# Altium footprint library PCB_IntegratedCircuit.PcbLib: 56 footprints (part 4 of 4)
Each footprint in its own frame and in the unit in brackets; x right, y up, seen from the top. Pads: shape width x height; smd on the part's side, far side on the other; paste and mask are expansions set on the pad; w line width, h text height; cw(c..) or ccw(c..) is an arc to the next point about the centre after c.
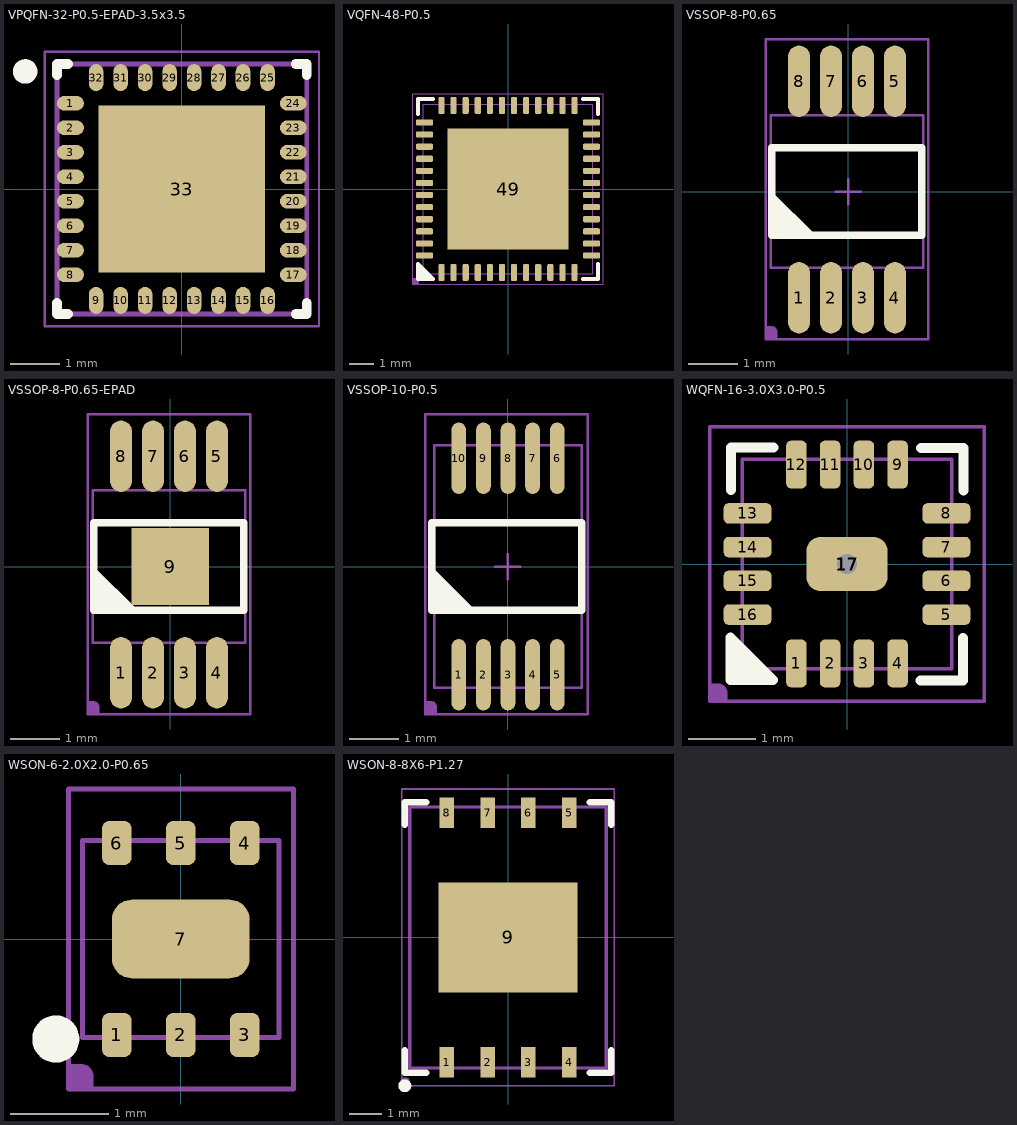
[diagram p3: the footprints below, top view; thin cyan lines are the x and y axes]

## VPQFN-32-P0.5-EPAD-3.5x3.5 [mm] "PQFN, 32-Leads, Body 5.00x5.00mm, Pitch 0.50mm, Thermal Pad 3.50x3.50mm, IPC Medium Density"
height 0.5
pads (33):
  oval 0.55x0.3 smd: 1(-2.275,1.75) 2(-2.275,1.25) 3(-2.275,0.75) 4(-2.275,0.25) 5(-2.275,-0.25) 6(-2.275,-0.75) 7(-2.275,-1.25) 8(-2.275,-1.75) 17(2.275,-1.75) 18(2.275,-1.25) 19(2.275,-0.75) 20(2.275,-0.25) 21(2.275,0.25) 22(2.275,0.75) 23(2.275,1.25) 24(2.275,1.75)
  oval 0.3x0.55 smd: 9(-1.75,-2.275) 10(-1.25,-2.275) 11(-0.75,-2.275) 12(-0.25,-2.275) 13(0.25,-2.275) 14(0.75,-2.275) 15(1.25,-2.275) 16(1.75,-2.275) 25(1.75,2.275) 26(1.25,2.275) 27(0.75,2.275) 28(0.25,2.275) 29(-0.25,2.275) 30(-0.75,2.275) 31(-1.25,2.275) 32(-1.75,2.275)
  rect 3.4x3.4 smd: 33(0,0)
Top Overlay:
  circle w0.25: c-3.2,2.4 r0.125
  lines w0.2: -2.55,-2.325 -2.55,-2.55 -2.325,-2.55 ; -2.55,2.325 -2.55,2.55 -2.325,2.55 ; 2.325,-2.55 2.55,-2.55 2.55,-2.325 ; 2.325,2.55 2.55,2.55 2.55,2.325
Top Assembly (Mech13):
  lines w0.1: -0.5,0 0.5,0 ; 0,-0.5 0,0.5 ; -2.55,-2.55 2.55,-2.55 2.55,2.55 -2.55,2.55 -2.55,-2.55
Top Component:
  lines w0.05: -2.8,-2.8 -2.8,2.8 2.8,2.8 2.8,-2.8 -2.8,-2.8
3D body: height 0.5, standoff 0, extent -2.55,-2.55 2.55,2.55

## VQFN-48-P0.5 [mil]
height 21.65
pads (49):
  rrect50% 10x28 smd: 1(-108.27,-136) 2(-88.58,-136) 3(-68.9,-136) 4(-49.21,-136) 5(-29.53,-136) 6(-9.84,-136) 7(9.84,-136) 8(29.53,-136) 9(49.21,-136) 10(68.9,-136) 11(88.58,-136) 12(108.27,-136) 25(108.27,136) 26(88.58,136) 27(68.9,136) 28(49.21,136) 29(29.53,136) 30(9.84,136) 31(-9.84,136) 32(-29.53,136) 33(-49.21,136) 34(-68.9,136) 35(-88.58,136) 36(-108.27,136)
  rrect50% 28x10 smd: 13(136,-108.27) 14(136,-88.58) 15(136,-68.9) 16(136,-49.21) 17(136,-29.53) 18(136,-9.84) 19(136,9.84) 20(136,29.53) 21(136,49.21) 22(136,68.9) 23(136,88.58) 24(136,108.27) 37(-136,108.27) 38(-136,88.58) 39(-136,68.9) 40(-136,49.21) 41(-136,29.53) 42(-136,9.84) 43(-136,-9.84) 44(-136,-29.53) 45(-136,-49.21) 46(-136,-68.9) 47(-136,-88.58) 48(-136,-108.27)
  rect 196.85x196.85 smd: 49(0,0)
Top Overlay:
  region: -146.67,-146.67 -146.67,-122 -122,-146.67
  lines w6: -146.67,122 -146.67,146.67 -122,146.67 ; 122,-146.67 146.67,-146.67 146.67,-122 ; 122,146.67 146.67,146.67 146.67,122 ; -146.67,-146.67 -146.67,-122 -122,-146.67 -146.67,-146.67
Top Solder:
  region: 108.27,-150 108.27,-122 -108.27,-122 -108.27,-150
  region: 150,108.27 122,108.27 122,-108.27 150,-108.27
  region: -108.27,150 -108.27,122 108.27,122 108.27,150
  rectangle: -150,-108.27 -122,108.27
Top Assembly (Mech13):
  lines w2: -10,0 10,0 ; 0,-10 0,10 ; -137.8,-137.79 137.8,-137.79 137.8,137.8 -137.8,137.8 -137.8,-137.79
Top Component:
  region: -155,-155 -155,-145 -150,-145 -149.01,-145 -147.17,-145.76 -145.76,-147.17 -145,-149.01 -145,-150 -145,-155
  lines w2: -155,-155 155,-155 155,155 -155,155 -155,-155
  text ".Designator" at -41,-20 h80
3D body "QFN50P700X700X55-48L.step": height 21.65, standoff 0, extent -138.59,-138.58 138.58,138.58

## VSSOP-8-P0.65 [mm]
height 1.1
pads (8):
  oval 0.45x1.45 smd: 1(-1,-2.159) 2(-0.35,-2.159) 3(0.3,-2.159) 4(0.95,-2.159) 5(0.95,2.241) 6(0.3,2.241) 7(-0.35,2.241) 8(-1,2.241)
Top Overlay:
  region: -1.549,-0.889 -1.549,0 -0.66,-0.889
  lines w0.152: -1.549,-0.889 1.499,-0.889 1.499,0.889 -1.549,0.889 -1.549,-0.889
Top Assembly (Mech13):
  lines w0.051: -0.254,0 0.254,0 ; 0,-0.254 0,0.254 ; -1.575,-1.55 -1.575,1.55 1.525,1.55 1.525,-1.55 -1.575,-1.55
Top Component:
  region: -1.7,-2.988 -1.7,-2.734 -1.573,-2.734 -1.548,-2.734 -1.501,-2.753 -1.465,-2.789 -1.446,-2.835 -1.446,-2.861 -1.446,-2.988
  lines w0.051: -1.676,-2.997 1.626,-2.997 1.626,3.099 -1.676,3.099 -1.676,-2.997
  text ".Designator" at -1.041,-0.508 h2.03
3D body "DGK0008A.stp": height 0.97, standoff 0, extent -1.524,-2.451 1.473,2.451

## VSSOP-8-P0.65-EPAD [mm]
height 1.1
pads (9):
  oval 0.45x1.45 smd: 1(-1,-2.159) 2(-0.35,-2.159) 3(0.3,-2.159) 4(0.95,-2.159) 5(0.95,2.241) 6(0.3,2.241) 7(-0.35,2.241) 8(-1,2.241)
  rect 1.57x1.57 smd: 9(0,0)
Top Overlay:
  region: -1.549,-0.889 -1.549,0 -0.66,-0.889
  lines w0.152: -1.549,-0.889 1.499,-0.889 1.499,0.889 -1.549,0.889 -1.549,-0.889
Top Assembly (Mech13):
  lines w0.051: -0.254,0 0.254,0 ; 0,-0.254 0,0.254 ; -1.575,-1.55 -1.575,1.55 1.525,1.55 1.525,-1.55 -1.575,-1.55
Top Component:
  region: -1.7,-2.988 -1.7,-2.734 -1.573,-2.734 -1.548,-2.734 -1.501,-2.753 -1.465,-2.789 -1.446,-2.835 -1.446,-2.861 -1.446,-2.988
  lines w0.051: -1.676,-2.997 1.626,-2.997 1.626,3.099 -1.676,3.099 -1.676,-2.997
  text ".Designator" at -1.041,-0.508 h2.03
3D body "DGK0008A.stp": height 0.97, standoff 0, extent -1.524,-2.451 1.473,2.451

## VSSOP-10-P0.5 [mm]
height 1.1
pads (10):
  oval 0.3x1.45 smd: 1(-1,-2.2) 2(-0.5,-2.2) 3(0,-2.2) 4(0.5,-2.2) 5(1,-2.2) 6(1,2.2) 7(0.5,2.2) 8(0,2.2) 9(-0.5,2.2) 10(-1,2.2)
Top Overlay:
  region: -1.549,-0.889 -1.549,0 -0.66,-0.889
  lines w0.152: -1.549,-0.889 -1.549,0.889 1.499,0.889 1.499,-0.889 -1.549,-0.889
Top Assembly (Mech13):
  lines w0.051: -0.254,0 0.254,0 ; 0,-0.254 0,0.254 ; -1.499,-2.464 1.5,-2.464 1.5,2.462 -1.499,2.462 -1.499,-2.464
Top Component:
  region: -1.7,-2.988 -1.7,-2.734 -1.573,-2.734 -1.548,-2.734 -1.501,-2.753 -1.465,-2.789 -1.446,-2.835 -1.446,-2.861 -1.446,-2.988
  lines w0.051: -1.676,-2.997 -1.676,3.099 1.626,3.099 1.626,-2.997 -1.676,-2.997
  text ".Designator" at -1.041,-0.549 h2.03
3D body "User Library-DGS0010A.STEP": height 1.1, standoff 0, extent -1.5,-2.463 1.5,2.462

## WQFN-16-3.0X3.0-P0.5 [mil]
height 23.62
pads (18):
  rrect50% 12x28 smd: 1(-29.53,-58) 2(-9.84,-58) 3(9.84,-58) 4(29.53,-58) 9(29.53,58) 10(9.84,58) 11(-9.84,58) 12(-29.53,58)
  rrect50% 28x12 smd: 5(58,-29.53) 6(58,-9.84) 7(58,9.84) 8(58,29.53) 13(-58,29.53) 14(-58,9.84) 15(-58,-9.84) 16(-58,-29.53)
  rrect50% 47.24x31.5 smd: 17(0,0)
  round 15.75 hole 11.81: 17(0,0)
Top Overlay:
  region: -68,-67.67 -68,-43 -43.33,-67.67
  lines w6: -67.67,43.33 -67.67,68 -43,68 ; 43,-68 67.67,-68 67.67,-43.33 ; 43.33,67.67 68,67.67 68,43 ; -68,-67.67 -43.33,-67.67 -68,-43 -68,-67.67
Top Solder:
  region: 29.53,-72 29.53,-44 -29.53,-44 -29.53,-72
  region: 72,29.53 44,29.53 44,-29.53 72,-29.53
  rectangle: -72,-29.53 -44,29.53
  region: -29.53,72 -29.53,44 29.53,44 29.53,72
Top Assembly (Mech13):
  lines w2: -10,0 10,0 ; 0,-10 0,10 ; -61.02,-61.02 -61.02,61.02 61.02,61.02 61.02,-61.02 -61.02,-61.02
Top Component:
  region: -80,-80 -80,-70 -75,-70 -74.01,-70 -72.17,-70.76 -70.76,-72.17 -70,-74.01 -70,-75 -70,-80
  lines w2: -80,-80 80,-80 80,80 -80,80 -80,-80
  text ".Designator" at -41,-20 h80
3D body "QFN50P300X300X100-16N.step": height 39.37, standoff 0, extent -59.06,-59.05 59.05,59.06

## WSON-6-2.0X2.0-P0.65 [mm]
height 0.75
pads (7):
  rrect50% 0.3x0.45 smd: 1(-0.65,-0.975) 2(0,-0.975) 3(0.65,-0.975) 4(0.65,0.975) 5(0,0.975) 6(-0.65,0.975)
  rrect50% 1.4x0.8 smd: 7(0,0)
Top Overlay:
  circle w0.254: c-1.27,-1.016 r0.112
Top Assembly (Mech13):
  lines w0.051: -0.254,0 0.254,0 ; 0,-0.254 0,0.254 ; -1,-1 1,-1 1,1 -1,1 -1,-1
Top Component:
  region: -1.143,-1.524 -1.143,-1.27 -1.016,-1.27 -0.991,-1.27 -0.944,-1.289 -0.908,-1.325 -0.889,-1.372 -0.889,-1.397 -0.889,-1.524
  lines w0.051: -1.143,-1.524 1.143,-1.524 1.143,1.524 -1.143,1.524 -1.143,-1.524
  text ".Designator" at -1.041,-0.508 h2.03
3D body: height 0.8, standoff 0, extent -1,-1 1,1

## WSON-8-8X6-P1.27 [mm] "SON, 8-Leads, Body 6.00x8.00mm, Pitch 1.27mm, Thermal Pad 4.30x3.40mm, IPC Medium Density"
height 0.8
pads (9):
  rect 0.45x0.95 smd: 1(-1.905,-3.87) 2(-0.635,-3.87) 3(0.635,-3.87) 4(1.905,-3.87) 5(1.905,3.87) 6(0.635,3.87) 7(-0.635,3.87) 8(-1.905,3.87)
  rect 4.3x3.4 smd paste-1.7: 9(0,0)
Top Overlay:
  circle w0.2: c-3.2,-4.6 r0.1
  lines w0.2: -3.2,-3.495 -3.2,-4.2 -2.53,-4.2 ; -3.2,3.495 -3.2,4.2 -2.53,4.2 ; 2.53,-4.2 3.2,-4.2 3.2,-3.495 ; 2.53,4.2 3.2,4.2 3.2,3.495
Top Paste:
  region: 2.045,0.665 2.045,1.595 0.815,1.595 0.815,0.665
  region: 0.615,0.665 0.615,1.595 -0.615,1.595 -0.615,0.665
  region: -0.815,0.665 -0.815,1.595 -2.045,1.595 -2.045,0.665
  region: 2.045,-0.465 2.045,0.465 0.815,0.465 0.815,-0.465
  region: 0.615,-0.465 0.615,0.465 -0.615,0.465 -0.615,-0.465
  region: -0.815,-0.465 -0.815,0.465 -2.045,0.465 -2.045,-0.465
  region: 2.045,-1.595 2.045,-0.665 0.815,-0.665 0.815,-1.595
  region: 0.615,-1.595 0.615,-0.665 -0.615,-0.665 -0.615,-1.595
  region: -0.815,-1.595 -0.815,-0.665 -2.045,-0.665 -2.045,-1.595
Top Assembly (Mech13):
  lines w0.1: -0.5,0 0.5,0 ; 0,-0.5 0,0.5 ; -3.05,-4.05 -3.05,4.05 3.05,4.05 3.05,-4.05 -3.05,-4.05
Top Component:
  region: -3.3,-4.605 -3.3,-4.351 -3.173,-4.351 -3.148,-4.351 -3.101,-4.37 -3.065,-4.406 -3.046,-4.453 -3.046,-4.478 -3.046,-4.605
  lines w0.05: -3.3,-4.605 -3.3,4.605 3.3,4.605 3.3,-4.605 -3.3,-4.605
  text ".Designator" at -1.041,-0.635 h2.54
3D body: height 0.8, standoff 0, extent -3.05,-4.05 3.05,4.05